# Altium footprint library common.PcbLib: 552 footprints (part 6 of 35)
Each footprint in its own frame and in the unit in brackets; x right, y up, seen from the top. Pads: shape width x height; smd on the part's side, far side on the other; paste and mask are expansions set on the pad; w line width, h text height; cw(c..) or ccw(c..) is an arc to the next point about the centre after c.
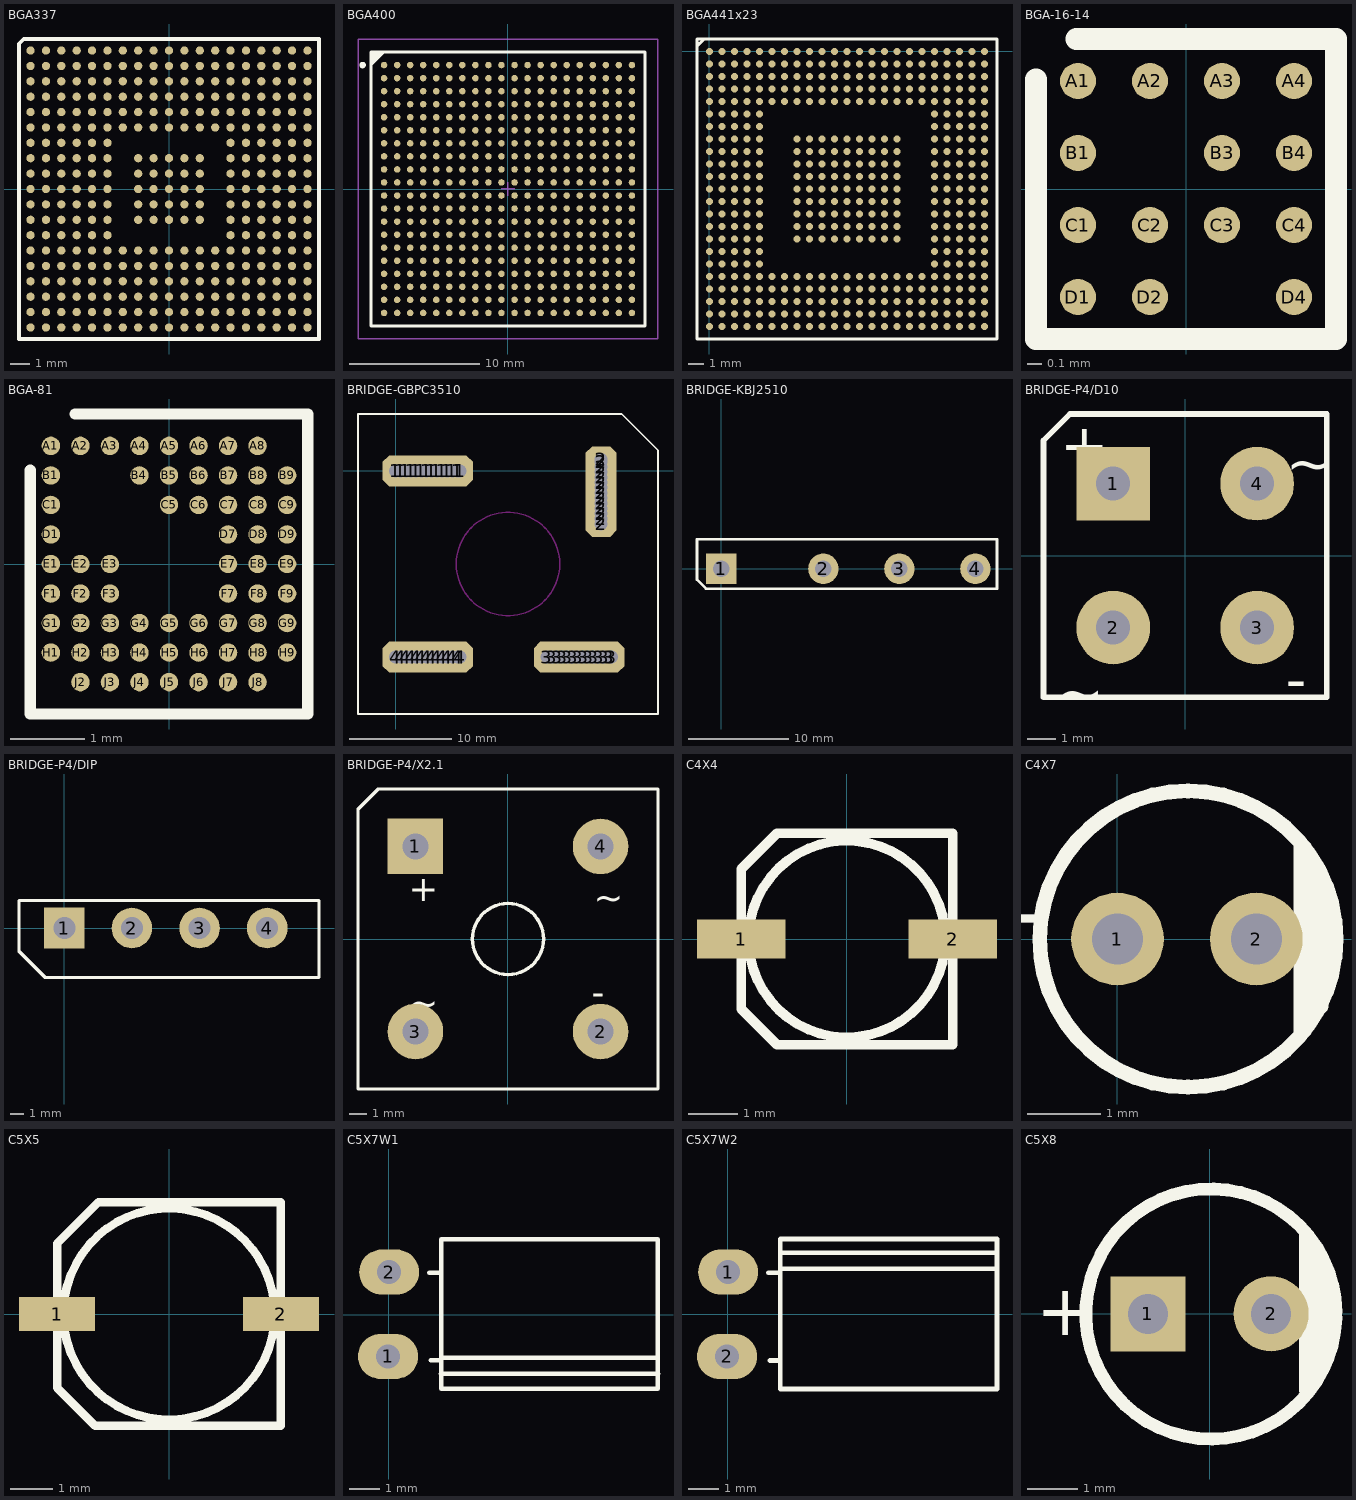
[diagram p5: the footprints below, top view; thin cyan lines are the x and y axes]

## BGA337 [mil]
pads (337):
  round 17 smd mask+3: A1(-283.46,283.46) A2(-251.97,283.46) A3(-220.47,283.46) A4(-188.98,283.46) A5(-157.48,283.46) A6(-125.98,283.46) A7(-94.49,283.46) A8(-62.99,283.46) A9(-31.5,283.46) A10(0,283.46) A11(31.5,283.46) A12(62.99,283.46) A13(94.49,283.46) A14(125.98,283.46) A15(157.48,283.46) A16(188.98,283.46) A17(220.47,283.46) A18(251.97,283.46) A19(283.46,283.46) B1(-283.46,251.97) B2(-251.97,251.97) B3(-220.47,251.97) B4(-188.98,251.97) B5(-157.48,251.97) B6(-125.98,251.97) B7(-94.49,251.97) B8(-62.99,251.97) B9(-31.5,251.97) B10(0,251.97) B11(31.5,251.97) B12(62.99,251.97) B13(94.49,251.97) B14(125.98,251.97) B15(157.48,251.97) B16(188.98,251.97) B17(220.47,251.97) B18(251.97,251.97) B19(283.46,251.97) C1(-283.46,220.47) C2(-251.97,220.47) C3(-220.47,220.47) C4(-188.98,220.47) C5(-157.48,220.47) C6(-125.98,220.47) C7(-94.49,220.47) C8(-62.99,220.47) C9(-31.5,220.47) C10(0,220.47) C11(31.5,220.47) C12(62.99,220.47) C13(94.49,220.47) C14(125.98,220.47) C15(157.48,220.47) C16(188.98,220.47) C17(220.47,220.47) C18(251.97,220.47) C19(283.46,220.47) D1(-283.46,188.98) D2(-251.97,188.98) D3(-220.47,188.98) D4(-188.98,188.98) D5(-157.48,188.98) D6(-125.98,188.98) D7(-94.49,188.98) D8(-62.99,188.98) D9(-31.5,188.98) D10(0,188.98) D11(31.5,188.98) D12(62.99,188.98) D13(94.49,188.98) D14(125.98,188.98) D15(157.48,188.98) D16(188.98,188.98) D17(220.47,188.98) D18(251.97,188.98) D19(283.46,188.98) E1(-283.46,157.48) E2(-251.97,157.48) E3(-220.47,157.48) E4(-188.98,157.48) E5(-157.48,157.48) E6(-125.98,157.48) E7(-94.49,157.48) E8(-62.99,157.48) E9(-31.5,157.48) E10(0,157.48) E11(31.5,157.48) E12(62.99,157.48) E13(94.49,157.48) E14(125.98,157.48) E15(157.48,157.48) E16(188.98,157.48) E17(220.47,157.48) E18(251.97,157.48) E19(283.46,157.48) F1(-283.46,125.98) F2(-251.97,125.98) F3(-220.47,125.98) F4(-188.98,125.98) F5(-157.48,125.98) F6(-125.98,125.98) F7(-94.49,125.98) F8(-62.99,125.98) F9(-31.5,125.98) F10(0,125.98) F11(31.5,125.98) F12(62.99,125.98) F13(94.49,125.98) F14(125.98,125.98) F15(157.48,125.98) F16(188.98,125.98) F17(220.47,125.98) F18(251.97,125.98) F19(283.46,125.98) G1(-283.46,94.49) G2(-251.97,94.49) G3(-220.47,94.49) G4(-188.98,94.49) G5(-157.48,94.49) G6(-125.98,94.49) G14(125.98,94.49) G15(157.48,94.49) G16(188.98,94.49) G17(220.47,94.49) G18(251.97,94.49) G19(283.46,94.49) H1(-283.46,62.99) H2(-251.97,62.99) H3(-220.47,62.99) H4(-188.98,62.99) H5(-157.48,62.99) H6(-125.98,62.99) H8(-62.99,62.99) H9(-31.5,62.99) H10(0,62.99) H11(31.5,62.99) H12(62.99,62.99) H14(125.98,62.99) H15(157.48,62.99) H16(188.98,62.99) H17(220.47,62.99) H18(251.97,62.99) H19(283.46,62.99) J1(-283.46,31.5) J2(-251.97,31.5) J3(-220.47,31.5) J4(-188.98,31.5) J5(-157.48,31.5) J6(-125.98,31.5) J8(-62.99,31.5) J9(-31.5,31.5) J10(0,31.5) J11(31.5,31.5) J12(62.99,31.5) J14(125.98,31.5) J15(157.48,31.5) J16(188.98,31.5) J17(220.47,31.5) J18(251.97,31.5) J19(283.46,31.5) K1(-283.46,0) K2(-251.97,0) K3(-220.47,0) K4(-188.98,0) K5(-157.48,0) K6(-125.98,0) K8(-62.99,0) K9(-31.5,0) K10(0,0) K11(31.5,0) K12(62.99,0) K14(125.98,0) K15(157.48,0) K16(188.98,0) K17(220.47,0) K18(251.97,0) K19(283.46,0) L1(-283.46,-31.5) L2(-251.97,-31.5) L3(-220.47,-31.5) L4(-188.98,-31.5) L5(-157.48,-31.5) L6(-125.98,-31.5) L8(-62.99,-31.5) L9(-31.5,-31.5) L10(0,-31.5) L11(31.5,-31.5) L12(62.99,-31.5) L14(125.98,-31.5) L15(157.48,-31.5) L16(188.98,-31.5) L17(220.47,-31.5) L18(251.97,-31.5) L19(283.46,-31.5) M1(-283.46,-62.99) M2(-251.97,-62.99) M3(-220.47,-62.99) M4(-188.98,-62.99) M5(-157.48,-62.99) M6(-125.98,-62.99) M8(-62.99,-62.99) M9(-31.5,-62.99) M10(0,-62.99) M11(31.5,-62.99) M12(62.99,-62.99) M14(125.98,-62.99) M15(157.48,-62.99) M16(188.98,-62.99) M17(220.47,-62.99) M18(251.97,-62.99) M19(283.46,-62.99) N1(-283.46,-94.49) N2(-251.97,-94.49) N3(-220.47,-94.49) N4(-188.98,-94.49) N5(-157.48,-94.49) N6(-125.98,-94.49) N14(125.98,-94.49) N15(157.48,-94.49) N16(188.98,-94.49) N17(220.47,-94.49) N18(251.97,-94.49) N19(283.46,-94.49) P1(-283.46,-125.98) P2(-251.97,-125.98) P3(-220.47,-125.98) P4(-188.98,-125.98) P5(-157.48,-125.98) P6(-125.98,-125.98) P7(-94.49,-125.98) P8(-62.99,-125.98) P9(-31.5,-125.98) P10(0,-125.98) P11(31.5,-125.98) P12(62.99,-125.98) P13(94.49,-125.98) P14(125.98,-125.98) P15(157.48,-125.98) P16(188.98,-125.98) P17(220.47,-125.98) P18(251.97,-125.98) P19(283.46,-125.98) R1(-283.46,-157.48) R2(-251.97,-157.48) R3(-220.47,-157.48) R4(-188.98,-157.48) R5(-157.48,-157.48) R6(-125.98,-157.48) R7(-94.49,-157.48) R8(-62.99,-157.48) R9(-31.5,-157.48) R10(0,-157.48) R11(31.5,-157.48) R12(62.99,-157.48) R13(94.49,-157.48) R14(125.98,-157.48) R15(157.48,-157.48) R16(188.98,-157.48) R17(220.47,-157.48) R18(251.97,-157.48) R19(283.46,-157.48) T1(-283.46,-188.98) T2(-251.97,-188.98) T3(-220.47,-188.98) T4(-188.98,-188.98) T5(-157.48,-188.98) T6(-125.98,-188.98) T7(-94.49,-188.98) T8(-62.99,-188.98) T9(-31.5,-188.98) T10(0,-188.98) T11(31.5,-188.98) T12(62.99,-188.98) T13(94.49,-188.98) T14(125.98,-188.98) T15(157.48,-188.98) T16(188.98,-188.98) T17(220.47,-188.98) T18(251.97,-188.98) T19(283.46,-188.98) U1(-283.46,-220.47) U2(-251.97,-220.47) U3(-220.47,-220.47) U4(-188.98,-220.47) U5(-157.48,-220.47) U6(-125.98,-220.47) U7(-94.49,-220.47) U8(-62.99,-220.47) U9(-31.5,-220.47) U10(0,-220.47) U11(31.5,-220.47) U12(62.99,-220.47) U13(94.49,-220.47) U14(125.98,-220.47) U15(157.48,-220.47) U16(188.98,-220.47) U17(220.47,-220.47) U18(251.97,-220.47) U19(283.46,-220.47) V1(-283.46,-251.97) V2(-251.97,-251.97) V3(-220.47,-251.97) V4(-188.98,-251.97) V5(-157.48,-251.97) V6(-125.98,-251.97) V7(-94.49,-251.97) V8(-62.99,-251.97) V9(-31.5,-251.97) V10(0,-251.97) V11(31.5,-251.97) V12(62.99,-251.97) V13(94.49,-251.97) V14(125.98,-251.97) V15(157.48,-251.97) V16(188.98,-251.97) V17(220.47,-251.97) V18(251.97,-251.97) V19(283.46,-251.97) W1(-283.46,-283.46) W2(-251.97,-283.46) W3(-220.47,-283.46) W4(-188.98,-283.46) W5(-157.48,-283.46) W6(-125.98,-283.46) W7(-94.49,-283.46) W8(-62.99,-283.46) W9(-31.5,-283.46) W10(0,-283.46) W11(31.5,-283.46) W12(62.99,-283.46) W13(94.49,-283.46) W14(125.98,-283.46) W15(157.48,-283.46) W16(188.98,-283.46) W17(220.47,-283.46) W18(251.97,-283.46) W19(283.46,-283.46)
Top Overlay:
  lines w7.87: -307.09,-307.09 -307.09,297.29 -297.29,307.09 307.09,307.09 307.09,-307.09 -307.09,-307.09
3D body: height 39.37, standoff 9.84, extent -307.87,-307.09 307.09,307.87

## BGA400 [mm] "BGA, 400-Leads, Body 21x21mm, Pitch 1mm"
height 2.43
pads (400):
  round 0.5 smd: A1(-9.5,9.5) A2(-8.5,9.5) A3(-7.5,9.5) A4(-6.5,9.5) A5(-5.5,9.5) A6(-4.5,9.5) A7(-3.5,9.5) A8(-2.5,9.5) A9(-1.5,9.5) A10(-0.5,9.5) A11(0.5,9.5) A12(1.5,9.5) A13(2.5,9.5) A14(3.5,9.5) A15(4.5,9.5) A16(5.5,9.5) A17(6.5,9.5) A18(7.5,9.5) A19(8.5,9.5) A20(9.5,9.5) B1(-9.5,8.5) B2(-8.5,8.5) B3(-7.5,8.5) B4(-6.5,8.5) B5(-5.5,8.5) B6(-4.5,8.5) B7(-3.5,8.5) B8(-2.5,8.5) B9(-1.5,8.5) B10(-0.5,8.5) B11(0.5,8.5) B12(1.5,8.5) B13(2.5,8.5) B14(3.5,8.5) B15(4.5,8.5) B16(5.5,8.5) B17(6.5,8.5) B18(7.5,8.5) B19(8.5,8.5) B20(9.5,8.5) C1(-9.5,7.5) C2(-8.5,7.5) C3(-7.5,7.5) C4(-6.5,7.5) C5(-5.5,7.5) C6(-4.5,7.5) C7(-3.5,7.5) C8(-2.5,7.5) C9(-1.5,7.5) C10(-0.5,7.5) C11(0.5,7.5) C12(1.5,7.5) C13(2.5,7.5) C14(3.5,7.5) C15(4.5,7.5) C16(5.5,7.5) C17(6.5,7.5) C18(7.5,7.5) C19(8.5,7.5) C20(9.5,7.5) D1(-9.5,6.5) D2(-8.5,6.5) D3(-7.5,6.5) D4(-6.5,6.5) D5(-5.5,6.5) D6(-4.5,6.5) D7(-3.5,6.5) D8(-2.5,6.5) D9(-1.5,6.5) D10(-0.5,6.5) D11(0.5,6.5) D12(1.5,6.5) D13(2.5,6.5) D14(3.5,6.5) D15(4.5,6.5) D16(5.5,6.5) D17(6.5,6.5) D18(7.5,6.5) D19(8.5,6.5) D20(9.5,6.5) E1(-9.5,5.5) E2(-8.5,5.5) E3(-7.5,5.5) E4(-6.5,5.5) E5(-5.5,5.5) E6(-4.5,5.5) E7(-3.5,5.5) E8(-2.5,5.5) E9(-1.5,5.5) E10(-0.5,5.5) E11(0.5,5.5) E12(1.5,5.5) E13(2.5,5.5) E14(3.5,5.5) E15(4.5,5.5) E16(5.5,5.5) E17(6.5,5.5) E18(7.5,5.5) E19(8.5,5.5) E20(9.5,5.5) F1(-9.5,4.5) F2(-8.5,4.5) F3(-7.5,4.5) F4(-6.5,4.5) F5(-5.5,4.5) F6(-4.5,4.5) F7(-3.5,4.5) F8(-2.5,4.5) F9(-1.5,4.5) F10(-0.5,4.5) F11(0.5,4.5) F12(1.5,4.5) F13(2.5,4.5) F14(3.5,4.5) F15(4.5,4.5) F16(5.5,4.5) F17(6.5,4.5) F18(7.5,4.5) F19(8.5,4.5) F20(9.5,4.5) G1(-9.5,3.5) G2(-8.5,3.5) G3(-7.5,3.5) G4(-6.5,3.5) G5(-5.5,3.5) G6(-4.5,3.5) G7(-3.5,3.5) G8(-2.5,3.5) G9(-1.5,3.5) G10(-0.5,3.5) G11(0.5,3.5) G12(1.5,3.5) G13(2.5,3.5) G14(3.5,3.5) G15(4.5,3.5) G16(5.5,3.5) G17(6.5,3.5) G18(7.5,3.5) G19(8.5,3.5) G20(9.5,3.5) H1(-9.5,2.5) H2(-8.5,2.5) H3(-7.5,2.5) H4(-6.5,2.5) H5(-5.5,2.5) H6(-4.5,2.5) H7(-3.5,2.5) H8(-2.5,2.5) H9(-1.5,2.5) H10(-0.5,2.5) H11(0.5,2.5) H12(1.5,2.5) H13(2.5,2.5) H14(3.5,2.5) H15(4.5,2.5) H16(5.5,2.5) H17(6.5,2.5) H18(7.5,2.5) H19(8.5,2.5) H20(9.5,2.5) J1(-9.5,1.5) J2(-8.5,1.5) J3(-7.5,1.5) J4(-6.5,1.5) J5(-5.5,1.5) J6(-4.5,1.5) J7(-3.5,1.5) J8(-2.5,1.5) J9(-1.5,1.5) J10(-0.5,1.5) J11(0.5,1.5) J12(1.5,1.5) J13(2.5,1.5) J14(3.5,1.5) J15(4.5,1.5) J16(5.5,1.5) J17(6.5,1.5) J18(7.5,1.5) J19(8.5,1.5) J20(9.5,1.5) K1(-9.5,0.5) K2(-8.5,0.5) K3(-7.5,0.5) K4(-6.5,0.5) K5(-5.5,0.5) K6(-4.5,0.5) K7(-3.5,0.5) K8(-2.5,0.5) K9(-1.5,0.5) K10(-0.5,0.5) K11(0.5,0.5) K12(1.5,0.5) K13(2.5,0.5) K14(3.5,0.5) K15(4.5,0.5) K16(5.5,0.5) K17(6.5,0.5) K18(7.5,0.5) K19(8.5,0.5) K20(9.5,0.5) L1(-9.5,-0.5) L2(-8.5,-0.5) L3(-7.5,-0.5) L4(-6.5,-0.5) L5(-5.5,-0.5) L6(-4.5,-0.5) L7(-3.5,-0.5) L8(-2.5,-0.5) L9(-1.5,-0.5) L10(-0.5,-0.5) L11(0.5,-0.5) L12(1.5,-0.5) L13(2.5,-0.5) L14(3.5,-0.5) L15(4.5,-0.5) L16(5.5,-0.5) L17(6.5,-0.5) L18(7.5,-0.5) L19(8.5,-0.5) L20(9.5,-0.5) M1(-9.5,-1.5) M2(-8.5,-1.5) M3(-7.5,-1.5) M4(-6.5,-1.5) M5(-5.5,-1.5) M6(-4.5,-1.5) M7(-3.5,-1.5) M8(-2.5,-1.5) M9(-1.5,-1.5) M10(-0.5,-1.5) M11(0.5,-1.5) M12(1.5,-1.5) M13(2.5,-1.5) M14(3.5,-1.5) M15(4.5,-1.5) M16(5.5,-1.5) M17(6.5,-1.5) M18(7.5,-1.5) M19(8.5,-1.5) M20(9.5,-1.5) N1(-9.5,-2.5) N2(-8.5,-2.5) N3(-7.5,-2.5) N4(-6.5,-2.5) N5(-5.5,-2.5) N6(-4.5,-2.5) N7(-3.5,-2.5) N8(-2.5,-2.5) N9(-1.5,-2.5) N10(-0.5,-2.5) N11(0.5,-2.5) N12(1.5,-2.5) N13(2.5,-2.5) N14(3.5,-2.5) N15(4.5,-2.5) N16(5.5,-2.5) N17(6.5,-2.5) N18(7.5,-2.5) N19(8.5,-2.5) N20(9.5,-2.5) P1(-9.5,-3.5) P2(-8.5,-3.5) P3(-7.5,-3.5) P4(-6.5,-3.5) P5(-5.5,-3.5) P6(-4.5,-3.5) P7(-3.5,-3.5) P8(-2.5,-3.5) P9(-1.5,-3.5) P10(-0.5,-3.5) P11(0.5,-3.5) P12(1.5,-3.5) P13(2.5,-3.5) P14(3.5,-3.5) P15(4.5,-3.5) P16(5.5,-3.5) P17(6.5,-3.5) P18(7.5,-3.5) P19(8.5,-3.5) P20(9.5,-3.5) R1(-9.5,-4.5) R2(-8.5,-4.5) R3(-7.5,-4.5) R4(-6.5,-4.5) R5(-5.5,-4.5) R6(-4.5,-4.5) R7(-3.5,-4.5) R8(-2.5,-4.5) R9(-1.5,-4.5) R10(-0.5,-4.5) R11(0.5,-4.5) R12(1.5,-4.5) R13(2.5,-4.5) R14(3.5,-4.5) R15(4.5,-4.5) R16(5.5,-4.5) R17(6.5,-4.5) R18(7.5,-4.5) R19(8.5,-4.5) R20(9.5,-4.5) T1(-9.5,-5.5) T2(-8.5,-5.5) T3(-7.5,-5.5) T4(-6.5,-5.5) T5(-5.5,-5.5) T6(-4.5,-5.5) T7(-3.5,-5.5) T8(-2.5,-5.5) T9(-1.5,-5.5) T10(-0.5,-5.5) T11(0.5,-5.5) T12(1.5,-5.5) T13(2.5,-5.5) T14(3.5,-5.5) T15(4.5,-5.5) T16(5.5,-5.5) T17(6.5,-5.5) T18(7.5,-5.5) T19(8.5,-5.5) T20(9.5,-5.5) U1(-9.5,-6.5) U2(-8.5,-6.5) U3(-7.5,-6.5) U4(-6.5,-6.5) U5(-5.5,-6.5) U6(-4.5,-6.5) U7(-3.5,-6.5) U8(-2.5,-6.5) U9(-1.5,-6.5) U10(-0.5,-6.5) U11(0.5,-6.5) U12(1.5,-6.5) U13(2.5,-6.5) U14(3.5,-6.5) U15(4.5,-6.5) U16(5.5,-6.5) U17(6.5,-6.5) U18(7.5,-6.5) U19(8.5,-6.5) U20(9.5,-6.5) V1(-9.5,-7.5) V2(-8.5,-7.5) V3(-7.5,-7.5) V4(-6.5,-7.5) V5(-5.5,-7.5) V6(-4.5,-7.5) V7(-3.5,-7.5) V8(-2.5,-7.5) V9(-1.5,-7.5) V10(-0.5,-7.5) V11(0.5,-7.5) V12(1.5,-7.5) V13(2.5,-7.5) V14(3.5,-7.5) V15(4.5,-7.5) V16(5.5,-7.5) V17(6.5,-7.5) V18(7.5,-7.5) V19(8.5,-7.5) V20(9.5,-7.5) W1(-9.5,-8.5) W2(-8.5,-8.5) W3(-7.5,-8.5) W4(-6.5,-8.5) W5(-5.5,-8.5) W6(-4.5,-8.5) W7(-3.5,-8.5) W8(-2.5,-8.5) W9(-1.5,-8.5) W10(-0.5,-8.5) W11(0.5,-8.5) W12(1.5,-8.5) W13(2.5,-8.5) W14(3.5,-8.5) W15(4.5,-8.5) W16(5.5,-8.5) W17(6.5,-8.5) W18(7.5,-8.5) W19(8.5,-8.5) W20(9.5,-8.5) Y1(-9.5,-9.5) Y2(-8.5,-9.5) Y3(-7.5,-9.5) Y4(-6.5,-9.5) Y5(-5.5,-9.5) Y6(-4.5,-9.5) Y7(-3.5,-9.5) Y8(-2.5,-9.5) Y9(-1.5,-9.5) Y10(-0.5,-9.5) Y11(0.5,-9.5) Y12(1.5,-9.5) Y13(2.5,-9.5) Y14(3.5,-9.5) Y15(4.5,-9.5) Y16(5.5,-9.5) Y17(6.5,-9.5) Y18(7.5,-9.5) Y19(8.5,-9.5) Y20(9.5,-9.5)
Top Overlay:
  circle w0.25: c-11.15,9.5 r0.125
  region: -9.5,10.5 -10.5,9.5 -10.5,10.5
  lines w0.2: -10.5,9.5 -9.5,10.5 ; -10.5,-10.5 -10.5,10.5 10.5,10.5 10.5,-10.5 -10.5,-10.5
Mechanical 13:
  lines w0.1: -10.5,-10.5 10.5,-10.5 10.5,10.5 -10.5,10.5 -10.5,-10.5
Mechanical 15:
  lines w0.1: -0.5,0 0.5,0 ; 0,-0.5 0,0.5 ; -11.5,-11.5 11.5,-11.5 11.5,11.5 -11.5,11.5 -11.5,-11.5
3D body: height 2.43, standoff 0, extent -10.5,-10.5 10.5,10.5

## BGA441x23 [mm]
pads (441):
  round 0.45 smd: A1(0,0) A2(0.8,0) A3(1.6,0) A4(2.4,0) A5(3.2,0) A6(4,0) A7(4.8,0) A8(5.6,0) A9(6.4,0) A10(7.2,0) A11(8,0) A12(8.8,0) A13(9.6,0) A14(10.4,0) A15(11.2,0) A16(12,0) A17(12.8,0) A18(13.6,0) A19(14.4,0) A20(15.2,0) A21(16,0) A22(16.8,0) A23(17.6,0) AA1(0,-16) AA2(0.8,-16) AA3(1.6,-16) AA4(2.4,-16) AA5(3.2,-16) AA6(4,-16) AA7(4.8,-16) AA8(5.6,-16) AA9(6.4,-16) AA10(7.2,-16) AA11(8,-16) AA12(8.8,-16) AA13(9.6,-16) AA14(10.4,-16) AA15(11.2,-16) AA16(12,-16) AA17(12.8,-16) AA18(13.6,-16) AA19(14.4,-16) AA20(15.2,-16) AA21(16,-16) AA22(16.8,-16) AA23(17.6,-16) AB1(0,-16.8) AB2(0.8,-16.8) AB3(1.6,-16.8) AB4(2.4,-16.8) AB5(3.2,-16.8) AB6(4,-16.8) AB7(4.8,-16.8) AB8(5.6,-16.8) AB9(6.4,-16.8) AB10(7.2,-16.8) AB11(8,-16.8) AB12(8.8,-16.8) AB13(9.6,-16.8) AB14(10.4,-16.8) AB15(11.2,-16.8) AB16(12,-16.8) AB17(12.8,-16.8) AB18(13.6,-16.8) AB19(14.4,-16.8) AB20(15.2,-16.8) AB21(16,-16.8) AB22(16.8,-16.8) AB23(17.6,-16.8) AC1(0,-17.6) AC2(0.8,-17.6) AC3(1.6,-17.6) AC4(2.4,-17.6) AC5(3.2,-17.6) AC6(4,-17.6) AC7(4.8,-17.6) AC8(5.6,-17.6) AC9(6.4,-17.6) AC10(7.2,-17.6) AC11(8,-17.6) AC12(8.8,-17.6) AC13(9.6,-17.6) AC14(10.4,-17.6) AC15(11.2,-17.6) AC16(12,-17.6) AC17(12.8,-17.6) AC18(13.6,-17.6) AC19(14.4,-17.6) AC20(15.2,-17.6) AC21(16,-17.6) AC22(16.8,-17.6) AC23(17.6,-17.6) B1(0,-0.8) B2(0.8,-0.8) B3(1.6,-0.8) B4(2.4,-0.8) B5(3.2,-0.8) B6(4,-0.8) B7(4.8,-0.8) B8(5.6,-0.8) B9(6.4,-0.8) B10(7.2,-0.8) B11(8,-0.8) B12(8.8,-0.8) B13(9.6,-0.8) B14(10.4,-0.8) B15(11.2,-0.8) B16(12,-0.8) B17(12.8,-0.8) B18(13.6,-0.8) B19(14.4,-0.8) B20(15.2,-0.8) B21(16,-0.8) B22(16.8,-0.8) B23(17.6,-0.8) C1(0,-1.6) C2(0.8,-1.6) C3(1.6,-1.6) C4(2.4,-1.6) C5(3.2,-1.6) C6(4,-1.6) C7(4.8,-1.6) C8(5.6,-1.6) C9(6.4,-1.6) C10(7.2,-1.6) C11(8,-1.6) C12(8.8,-1.6) C13(9.6,-1.6) C14(10.4,-1.6) C15(11.2,-1.6) C16(12,-1.6) C17(12.8,-1.6) C18(13.6,-1.6) C19(14.4,-1.6) C20(15.2,-1.6) C21(16,-1.6) C22(16.8,-1.6) C23(17.6,-1.6) D1(0,-2.4) D2(0.8,-2.4) D3(1.6,-2.4) D4(2.4,-2.4) D5(3.2,-2.4) D6(4,-2.4) D7(4.8,-2.4) D8(5.6,-2.4) D9(6.4,-2.4) D10(7.2,-2.4) D11(8,-2.4) D12(8.8,-2.4) D13(9.6,-2.4) D14(10.4,-2.4) D15(11.2,-2.4) D16(12,-2.4) D17(12.8,-2.4) D18(13.6,-2.4) D19(14.4,-2.4) D20(15.2,-2.4) D21(16,-2.4) D22(16.8,-2.4) D23(17.6,-2.4) E1(0,-3.2) E2(0.8,-3.2) E3(1.6,-3.2) E4(2.4,-3.2) E5(3.2,-3.2) E6(4,-3.2) E7(4.8,-3.2) E8(5.6,-3.2) E9(6.4,-3.2) E10(7.2,-3.2) E11(8,-3.2) E12(8.8,-3.2) E13(9.6,-3.2) E14(10.4,-3.2) E15(11.2,-3.2) E16(12,-3.2) E17(12.8,-3.2) E18(13.6,-3.2) E19(14.4,-3.2) E20(15.2,-3.2) E21(16,-3.2) E22(16.8,-3.2) E23(17.6,-3.2) F1(0,-4) F2(0.8,-4) F3(1.6,-4) F4(2.4,-4) F5(3.2,-4) F19(14.4,-4) F20(15.2,-4) F21(16,-4) F22(16.8,-4) F23(17.6,-4) G1(0,-4.8) G2(0.8,-4.8) G3(1.6,-4.8) G4(2.4,-4.8) G5(3.2,-4.8) G19(14.4,-4.8) G20(15.2,-4.8) G21(16,-4.8) G22(16.8,-4.8) G23(17.6,-4.8) H1(0,-5.6) H2(0.8,-5.6) H3(1.6,-5.6) H4(2.4,-5.6) H5(3.2,-5.6) H8(5.6,-5.6) H9(6.4,-5.6) H10(7.2,-5.6) H11(8,-5.6) H12(8.8,-5.6) H13(9.6,-5.6) H14(10.4,-5.6) H15(11.2,-5.6) H16(12,-5.6) H19(14.4,-5.6) H20(15.2,-5.6) H21(16,-5.6) H22(16.8,-5.6) H23(17.6,-5.6) J1(0,-6.4) J2(0.8,-6.4) J3(1.6,-6.4) J4(2.4,-6.4) J5(3.2,-6.4) J8(5.6,-6.4) J9(6.4,-6.4) J10(7.2,-6.4) J11(8,-6.4) J12(8.8,-6.4) J13(9.6,-6.4) J14(10.4,-6.4) J15(11.2,-6.4) J16(12,-6.4) J19(14.4,-6.4) J20(15.2,-6.4) J21(16,-6.4) J22(16.8,-6.4) J23(17.6,-6.4) K1(0,-7.2) K2(0.8,-7.2) K3(1.6,-7.2) K4(2.4,-7.2) K5(3.2,-7.2) K8(5.6,-7.2) K9(6.4,-7.2) K10(7.2,-7.2) K11(8,-7.2) K12(8.8,-7.2) K13(9.6,-7.2) K14(10.4,-7.2) K15(11.2,-7.2) K16(12,-7.2) K19(14.4,-7.2) K20(15.2,-7.2) K21(16,-7.2) K22(16.8,-7.2) K23(17.6,-7.2) L1(0,-8) L2(0.8,-8) L3(1.6,-8) L4(2.4,-8) L5(3.2,-8) L8(5.6,-8) L9(6.4,-8) L10(7.2,-8) L11(8,-8) L12(8.8,-8) L13(9.6,-8) L14(10.4,-8) L15(11.2,-8) L16(12,-8) L19(14.4,-8) L20(15.2,-8) L21(16,-8) L22(16.8,-8) L23(17.6,-8) M1(0,-8.8) M2(0.8,-8.8) M3(1.6,-8.8) M4(2.4,-8.8) M5(3.2,-8.8) M8(5.6,-8.8) M9(6.4,-8.8) M10(7.2,-8.8) M11(8,-8.8) M12(8.8,-8.8) M13(9.6,-8.8) M14(10.4,-8.8) M15(11.2,-8.8) M16(12,-8.8) M19(14.4,-8.8) M20(15.2,-8.8) M21(16,-8.8) M22(16.8,-8.8) M23(17.6,-8.8) N1(0,-9.6) N2(0.8,-9.6) N3(1.6,-9.6) N4(2.4,-9.6) N5(3.2,-9.6) N8(5.6,-9.6) N9(6.4,-9.6) N10(7.2,-9.6) N11(8,-9.6) N12(8.8,-9.6) N13(9.6,-9.6) N14(10.4,-9.6) N15(11.2,-9.6) N16(12,-9.6) N19(14.4,-9.6) N20(15.2,-9.6) N21(16,-9.6) N22(16.8,-9.6) N23(17.6,-9.6) P1(0,-10.4) P2(0.8,-10.4) P3(1.6,-10.4) P4(2.4,-10.4) P5(3.2,-10.4) P8(5.6,-10.4) P9(6.4,-10.4) P10(7.2,-10.4) P11(8,-10.4) P12(8.8,-10.4) P13(9.6,-10.4) P14(10.4,-10.4) P15(11.2,-10.4) P16(12,-10.4) P19(14.4,-10.4) P20(15.2,-10.4) P21(16,-10.4) P22(16.8,-10.4) P23(17.6,-10.4) R1(0,-11.2) R2(0.8,-11.2) R3(1.6,-11.2) R4(2.4,-11.2) R5(3.2,-11.2) R8(5.6,-11.2) R9(6.4,-11.2) R10(7.2,-11.2) R11(8,-11.2) R12(8.8,-11.2) R13(9.6,-11.2) R14(10.4,-11.2) R15(11.2,-11.2) R16(12,-11.2) R19(14.4,-11.2) R20(15.2,-11.2) R21(16,-11.2) R22(16.8,-11.2) R23(17.6,-11.2) T1(0,-12) T2(0.8,-12) T3(1.6,-12) T4(2.4,-12) T5(3.2,-12) T8(5.6,-12) T9(6.4,-12) T10(7.2,-12) T11(8,-12) T12(8.8,-12) T13(9.6,-12) T14(10.4,-12) T15(11.2,-12) T16(12,-12) T19(14.4,-12) T20(15.2,-12) T21(16,-12) T22(16.8,-12) T23(17.6,-12) U1(0,-12.8) U2(0.8,-12.8) U3(1.6,-12.8) U4(2.4,-12.8) U5(3.2,-12.8) U19(14.4,-12.8) U20(15.2,-12.8) U21(16,-12.8) U22(16.8,-12.8) U23(17.6,-12.8) V1(0,-13.6) V2(0.8,-13.6) V3(1.6,-13.6) V4(2.4,-13.6) V5(3.2,-13.6) V19(14.4,-13.6) V20(15.2,-13.6) V21(16,-13.6) V22(16.8,-13.6) V23(17.6,-13.6) W1(0,-14.4) W2(0.8,-14.4) W3(1.6,-14.4) W4(2.4,-14.4) W5(3.2,-14.4) W6(4,-14.4) W7(4.8,-14.4) W8(5.6,-14.4) W9(6.4,-14.4) W10(7.2,-14.4) W11(8,-14.4) W12(8.8,-14.4) W13(9.6,-14.4) W14(10.4,-14.4) W15(11.2,-14.4) W16(12,-14.4) W17(12.8,-14.4) W18(13.6,-14.4) W19(14.4,-14.4) W20(15.2,-14.4) W21(16,-14.4) W22(16.8,-14.4) W23(17.6,-14.4) Y1(0,-15.2) Y2(0.8,-15.2) Y3(1.6,-15.2) Y4(2.4,-15.2) Y5(3.2,-15.2) Y6(4,-15.2) Y7(4.8,-15.2) Y8(5.6,-15.2) Y9(6.4,-15.2) Y10(7.2,-15.2) Y11(8,-15.2) Y12(8.8,-15.2) Y13(9.6,-15.2) Y14(10.4,-15.2) Y15(11.2,-15.2) Y16(12,-15.2) Y17(12.8,-15.2) Y18(13.6,-15.2) Y19(14.4,-15.2) Y20(15.2,-15.2) Y21(16,-15.2) Y22(16.8,-15.2) Y23(17.6,-15.2)
Top Overlay:
  lines w0.2: -0.781,0.362 -0.381,0.762 ; -0.8,-18.4 18.4,-18.4 18.4,0.8 -0.8,0.8 -0.8,-18.4
3D body: height 1.14, standoff 0.25, extent -0.762,-18.415 18.39,0.864

## BGA-16-14 [mm]
height 0.65
pads (14):
  round 0.25 smd: A1(-0.75,0.75) A2(-0.25,0.75) A3(0.25,0.75) A4(0.75,0.75) B1(-0.75,0.25) B3(0.25,0.25) B4(0.75,0.25) C1(-0.75,-0.25) C2(-0.25,-0.25) C3(0.25,-0.25) C4(0.75,-0.25) D1(-0.75,-0.75) D2(-0.25,-0.75) D4(0.75,-0.75)
Top Overlay:
  lines w0.152: -1.041,0.762 -1.041,-1.041 1.041,-1.041 1.041,1.041 -0.762,1.041
3D body: height 0.65, standoff 0, extent -0.98,-0.98 0.98,0.98

## BGA-81 [mm]
height 0.55
pads (62):
  round 0.25 smd: A1(-1.6,1.6) A2(-1.2,1.6) A3(-0.8,1.6) A4(-0.4,1.6) A5(0,1.6) A6(0.4,1.6) A7(0.8,1.6) A8(1.2,1.6) B1(-1.6,1.2) B4(-0.4,1.2) B5(0,1.2) B6(0.4,1.2) B7(0.8,1.2) B8(1.2,1.2) B9(1.6,1.2) C1(-1.6,0.8) C5(0,0.8) C6(0.4,0.8) C7(0.8,0.8) C8(1.2,0.8) C9(1.6,0.8) D1(-1.6,0.4) D7(0.8,0.4) D8(1.2,0.4) D9(1.6,0.4) E1(-1.6,0) E2(-1.2,0) E3(-0.8,0) E7(0.8,0) E8(1.2,0) E9(1.6,0) F1(-1.6,-0.4) F2(-1.2,-0.4) F3(-0.8,-0.4) F7(0.8,-0.4) F8(1.2,-0.4) F9(1.6,-0.4) G1(-1.6,-0.8) G2(-1.2,-0.8) G3(-0.8,-0.8) G4(-0.4,-0.8) G5(0,-0.8) G6(0.4,-0.8) G7(0.8,-0.8) G8(1.2,-0.8) G9(1.6,-0.8) H1(-1.6,-1.2) H2(-1.2,-1.2) H3(-0.8,-1.2) H4(-0.4,-1.2) H5(0,-1.2) H6(0.4,-1.2) H7(0.8,-1.2) H8(1.2,-1.2) H9(1.6,-1.2) J2(-1.2,-1.6) J3(-0.8,-1.6) J4(-0.4,-1.6) J5(0,-1.6) J6(0.4,-1.6) J7(0.8,-1.6) J8(1.2,-1.6)
Top Overlay:
  lines w0.152: -1.88,1.27 -1.88,-2.032 1.88,-2.032 1.88,2.032 -1.27,2.032
3D body: height 0.55, standoff 0, extent -1.775,-1.935 1.775,1.945

## BRIDGE-GBPC3510 [mil]
pads (56):
  oct 100x120 hole 50: 1(0,0) 1(20,0) 1(40,0) 1(60,0) 1(80,0) 1(100,0) 1(120,0) 1(140,0) 1(160,0) 1(180,0) 1(200,0) 1(220,0) 1(240,0) 1(250,0) 3(585,-720) 3(605,-720) 3(625,-720) 3(645,-720) 3(665,-720) 3(685,-720) 3(705,-720) 3(725,-720) 3(745,-720) 3(765,-720) 3(785,-720) 3(805,-720) 3(825,-720) 3(835,-720) 4(0,-720) 4(20,-720) 4(40,-720) 4(60,-720) 4(80,-720) 4(100,-720) 4(120,-720) 4(140,-720) 4(160,-720) 4(180,-720) 4(200,-720) 4(220,-720) 4(240,-720) 4(250,-720)
  oct 120x100 hole 50: 2(795,-205) 2(795,-165) 2(795,-145) 2(795,-125) 2(795,-105) 2(795,-85) 2(795,-65) 2(795,-45) 2(795,-25) 2(795,-5) 2(795,15) 2(795,35) 2(795,45) 2(795,-185)
Top Overlay:
  lines w6: -145,-940 1015,-940 1015,80 875,220 -145,220 -145,-940
Keep-Out Layer:
  circle w6: c435,-360 r200
3D body: height 374.02, standoff -492.13, extent -141.18,-922.36 961.18,180

## BRIDGE-KBJ2510 [mil]
pads (4):
  rect 120x120 hole 65: 1(0,0)
  round 120 hole 65: 2(401.57,0) 3(700.79,0) 4(1000,0)
Top Overlay:
  lines w9.84: 1085,-78 1085,116
  lines w10: 1085,-78 -60.43,-78 -95.92,-42.5 -95.92,116 1085,116
3D body: height 954.6, standoff -579.12, extent -90.35,-68.49 1090.57,120.49

## BRIDGE-P4/D10 [mm]
pads (4):
  rect 2.6x2.6 hole 1.2: 1(-2.54,2.54)
  round 2.6 hole 1.2: 2(-2.54,-2.54) 3(2.54,-2.54) 4(2.54,2.54)
Top Overlay:
  lines w0.2: -5,-5 -5,4.064 ; -5,-5 5,-5 ; -5,-5 5,-5 ; -5,-5 -5,4.064 ; -5,4.064 -4.064,5 ; -5,4.064 -4.064,5 ; -4.064,5 5,5 ; -4.064,5 5,5 ; 5,-5 5,5 ; 5,-5 5,5
  text "+" at -4.41,3.164 h1.5
  text "-" at 3.556,-5.08 h1.5
  text "~" at -4.572,-5.588 h1.5
  text "~" at 3.556,2.54 h1.5
3D body: height 3, standoff -2, extent -3.286,-3.286 -1.794,-1.794
3D body: height 3, standoff -2, extent 1.794,1.794 3.286,3.286
3D body: height 3, standoff -2, extent 1.794,-3.286 3.286,-1.794
3D body: height 3, standoff -2, extent -3.286,1.794 -1.794,3.286
3D body: height 3, standoff 1, extent -5.08,-5.08 5.08,5.08

## BRIDGE-P4/DIP [mil]
pads (4):
  rect 120x120 hole 65: 1(0,0)
  round 120 hole 65: 2(200,0) 3(400,0) 4(600,0)
Top Overlay:
  circle w10: c0,0 r53.85
  lines w9.84: 753.13,-145.87 753.13,81.42
  lines w10: 752.76,-146.24 -56,-146.24 -134,-68.24 -134,81.42 753.13,81.42
3D body: height 472.44, standoff 59.06, extent -135,-148 754,81
3D body: height 118.11, standoff -78.74, extent -19.37,-29.37 39.38,29.38
3D body: height 118.11, standoff -78.74, extent 170.63,-29.37 229.38,29.38
3D body: height 118.11, standoff -78.74, extent 380.63,-39.37 439.38,19.38
3D body: height 118.11, standoff -78.74, extent 570.63,-29.37 629.38,29.38

## BRIDGE-P4/X2.1 [mm]
pads (4):
  rect 3.2x3.2 hole 1.5: 1(-5.335,5.335)
  round 3.2 hole 1.5: 2(5.335,-5.335) 3(-5.335,-5.335) 4(5.335,5.335)
Top Overlay:
  circle w0.2: c0,0 r2.05
  lines w0.2: -8.65,-8.65 8.65,-8.65 8.65,8.65 -7.474,8.65 -8.65,7.474 -8.65,-8.65
  text "~" at -5.723,-4.437 h1.5
  text "~" at 4.945,1.659 h1.5
  text "-" at 4.825,-3.809 h1.5
  text "+" at -5.723,2.167 h1.5
3D body: height 3, standoff -2, extent 4.589,-6.081 6.081,-4.589
3D body: height 3, standoff -2, extent -6.081,-6.081 -4.589,-4.589
3D body: height 3, standoff -2, extent 4.589,4.589 6.081,6.081
3D body: height 3, standoff -2, extent -6.081,4.589 -4.589,6.081
3D body: height 4, standoff 1, extent -8.651,-8.651 8.651,8.651

## C4X4 [mm]
height 5.5
pads (2):
  rect 1.8x0.8 smd: 1(-2.15,0) 2(2.15,0)
Top Overlay:
  circle w0.2: c0,0 r2
  lines w0.2: -1.433,-2.139 -2.15,-1.422 ; -1.433,2.139 -2.15,1.422 ; -2.15,-1.422 -1.422,-2.15 2.15,-2.15 2.15,2.15 -1.422,2.15 -2.15,1.422 ; -2.15,-1.422 -2.15,1.422
3D body: height 5.2, standoff 0, extent -2.286,-2.159 2.314,2.141

## C4X7 [mm]
pads (2):
  round 1.27 hole 0.7: 1(0,0) 2(1.905,0)
Top Overlay:
  circle w0.203: c0.965,0 r2.032
  lines w0.254: 2.54,-1.245 2.54,1.245 ; 2.769,-0.914 2.769,0.864
  text "+" at -1.118,-0.305 h1.02
3D body: height 7.01, standoff -16.99, extent -1.028,-1.981 2.972,2.019

## C5X5 [mm]
height 5.5
pads (2):
  rect 1.8x0.8 smd: 1(-2.65,0) 2(2.65,0)
Top Overlay:
  circle w0.2: c0,0 r2.5
  lines w0.2: -2.65,-1.744 -1.744,-2.65 2.65,-2.65 2.65,2.65 -1.668,2.65 -2.65,1.668 -2.65,-1.744
3D body: height 5.2, standoff 0, extent -2.8,-2.667 2.8,2.633

## C5X7W1 [mm]
pads (2):
  oval 2x1.5 hole 0.8: 1(-0.024,-1.38) 2(0.012,1.428)
Top Overlay:
  lines w0.152: 1.351,1.409 1.684,1.409 ; 1.4,-1.513 1.723,-1.513 ; 1.729,-1.956 8.96,-1.956 ; 1.784,-1.422 8.905,-1.422 ; 1.75,-2.459 8.95,-2.459 8.95,2.525 1.75,2.525 1.75,-2.459
3D body: height 2.7, standoff -1.5, extent -0.233,0.75 2.433,1.823
3D body: height 2.7, standoff -1.5, extent -0.216,-1.76 2.465,-0.905
3D body: height 5.13, standoff 0.07, extent 1.731,-2.49 9.007,2.561

## C5X7W2 [mm]
pads (2):
  oval 2x1.5 hole 0.8: 1(0.018,1.404) 2(-0.018,-1.404)
Top Overlay:
  lines w0.152: 1.356,1.385 1.69,1.385 ; 1.406,-1.537 1.729,-1.537 ; 1.776,1.514 8.955,1.514 ; 1.83,2.048 8.955,2.048 ; 1.756,-2.483 1.756,2.501 8.956,2.501 8.956,-2.483 1.756,-2.483
3D body: height 2.7, standoff -1.5, extent -0.345,0.704 2.321,1.777
3D body: height 2.7, standoff -1.5, extent -0.376,-1.785 2.305,-0.93
3D body: height 5.13, standoff 0.07, extent 1.652,-2.519 8.927,2.531

## C5X8 [mm] "RB.1/.2"
pads (2):
  rect 1.5x1.5 hole 0.8: 1(-1.231,0)
  round 1.5 hole 0.8: 2(1.231,0)
Top Overlay:
  lines w0.254: 2.526,-0.076 cw(c0.028,-0.004) 2.527,0.037
  lines w0.3: 1.942,-1.524 1.942,1.549
  lines w0.5: 2.196,-0.94 2.196,0.94
  text "+" at -3.468,-0.432 h1.02
3D body: height 8.13, standoff -2.37, extent -2.499,-2.503 2.501,2.489